# Altium footprint library Gen_Devices.pcblib: 211 footprints (part 6 of 14)
Each footprint in its own frame and in the unit in brackets; x right, y up, seen from the top. Pads: shape width x height; smd on the part's side, far side on the other; paste and mask are expansions set on the pad; w line width, h text height; cw(c..) or ccw(c..) is an arc to the next point about the centre after c.
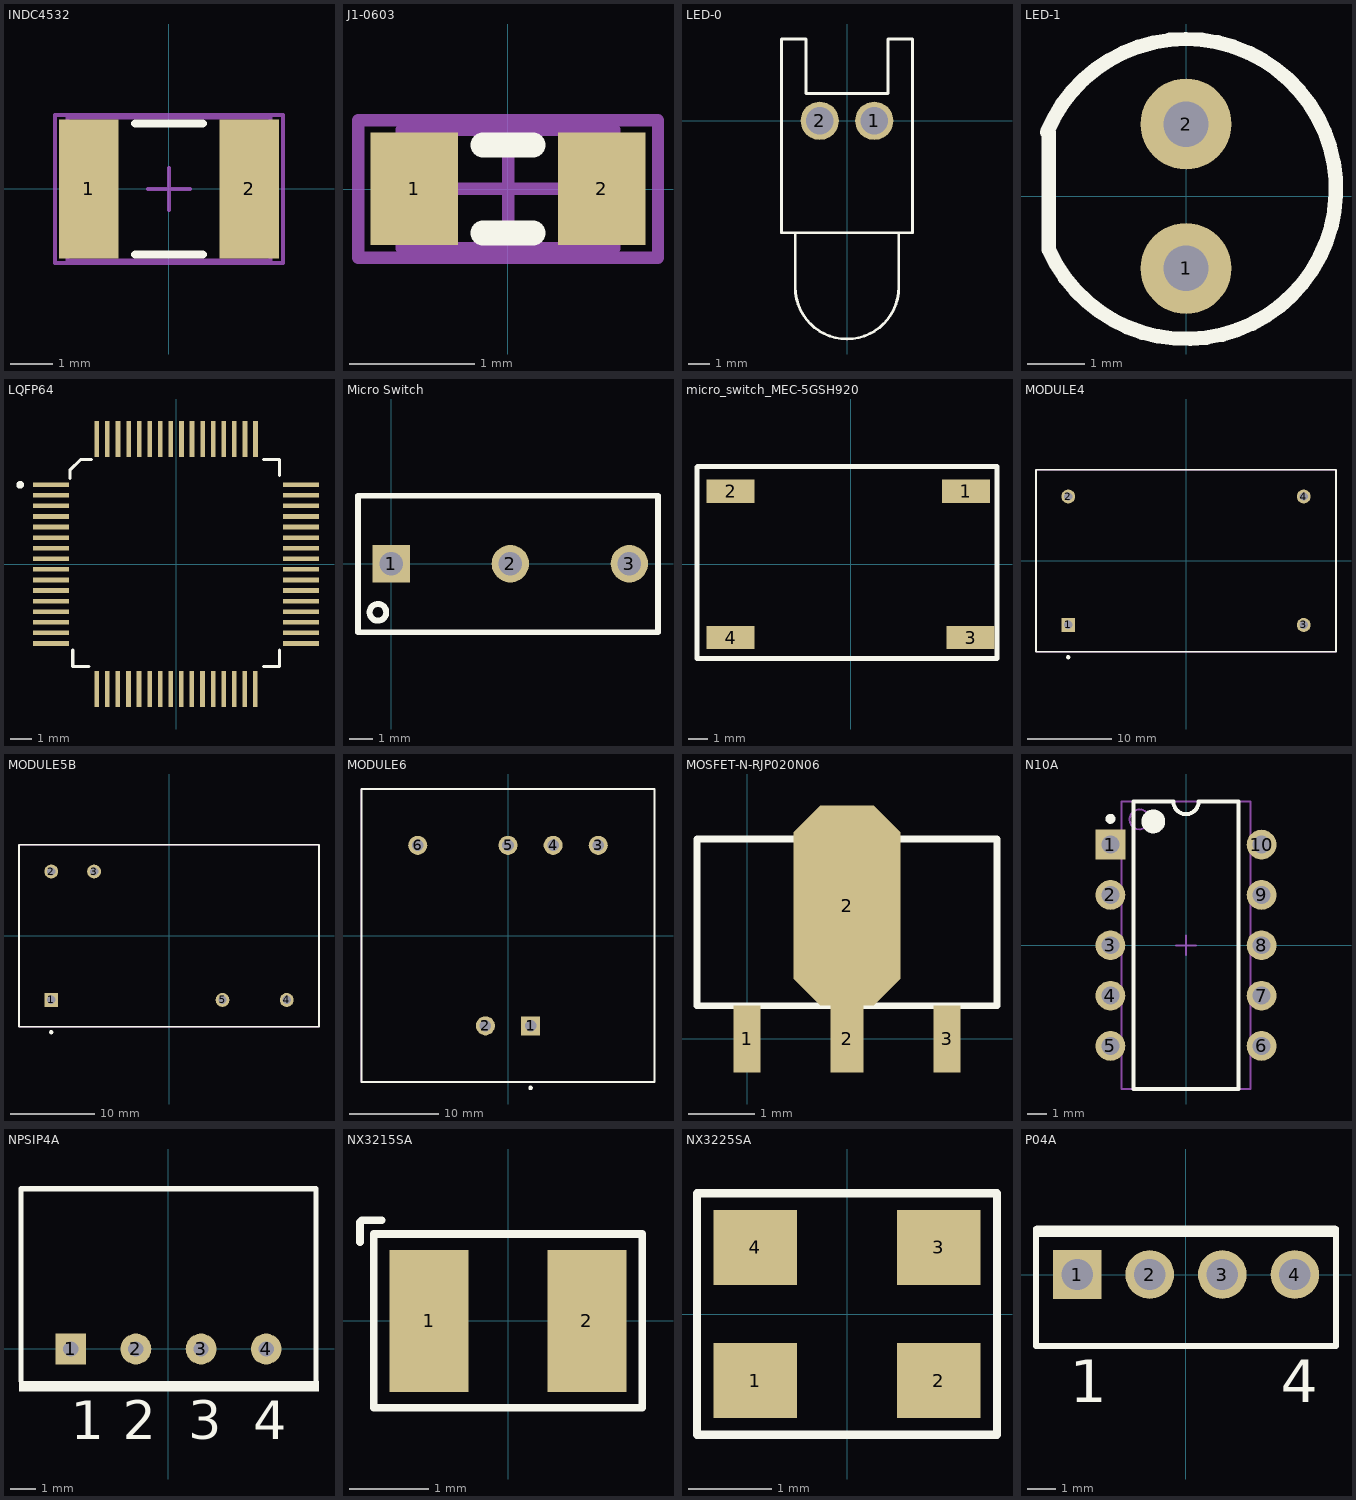
[diagram p5: the footprints below, top view; thin cyan lines are the x and y axes]

## INDC4532 [mm] "Chip Inductor, Body 4.5x3.2mm, IPC High Density"
height 0.55
pads (2):
  rect 1.4x3.3 smd: 1(-1.9,0) 2(1.9,0)
Top Overlay:
  lines w0.2: -0.8,-1.55 0.8,-1.55 ; -0.8,1.55 0.8,1.55
Mechanical 13:
  lines w0.1: -2.4,-1.7 2.4,-1.7 2.4,1.7 -2.4,1.7 -2.4,-1.7
Mechanical 15:
  lines w0.1: -0.5,0 0.5,0 ; 0,-0.5 0,0.5 ; -2.7,-1.75 2.7,-1.75 2.7,1.75 -2.7,1.75 -2.7,-1.75
3D body: height 0.55, standoff 0, extent -2.4,-1.7 2.4,1.7

## J1-0603 [mm] "Chip Resistor, Body 1.6x0.8mm, IPC High Density"
height 0.9
pads (2):
  rect 0.7x0.9 smd: 1(-0.75,0) 2(0.75,0)
Top Overlay:
  lines w0.2: -0.2,-0.35 0.2,-0.35 ; -0.2,0.35 0.2,0.35
Mechanical 13:
  lines w0.1: -0.85,-0.475 -0.85,0.475 0.85,0.475 0.85,-0.475 -0.85,-0.475
Mechanical 15:
  lines w0.1: -0.475,0 0.475,0 ; 0,-0.475 0,0.475 ; -1.2,-0.55 -1.2,0.55 1.2,0.55 1.2,-0.55 -1.2,-0.55
3D body: height 0.9, standoff 0, extent -0.85,-0.475 0.85,0.475

## LED-0 [mil] "LED; 2 Leads"
pads (2):
  round 70 hole 50: 1(50,0) 2(-50,0)
Top Overlay:
  lines w5: -95,-205 -95,-305 ccw(c0,-305) 95,-305 95,-205 ; -120,-205 -120,150 -75,150 -75,50 75,50 75,150 120,150 120,-205 -120,-205

## LED-1 [mm] "LED; 2 Leads"
pads (2):
  round 1.6 hole 0.8: 1(0,-1.27) 2(0,1.27)
Top Overlay:
  lines w0.254: -2.443,1.125 cw(c0,0.127) -2.413,-0.942 -2.413,1.113
3D body "GREENLED.step": height 5.38, standoff -3.17, extent -1.55,-1.967 1.942,2.017

## LQFP64 [mm]
pads (64):
  rect 1.7x0.22 smd: 1(-5.901,3.747) 2(-5.901,3.247) 3(-5.901,2.747) 4(-5.901,2.247) 5(-5.901,1.747) 6(-5.901,1.247) 7(-5.901,0.747) 8(-5.901,0.247) 9(-5.901,-0.253) 10(-5.901,-0.753) 11(-5.901,-1.253) 12(-5.901,-1.753) 13(-5.901,-2.253) 14(-5.901,-2.753) 15(-5.901,-3.253) 16(-5.901,-3.753) 33(5.902,-3.753) 34(5.902,-3.253) 35(5.902,-2.753) 36(5.902,-2.253) 37(5.902,-1.753) 38(5.902,-1.253) 39(5.902,-0.753) 40(5.902,-0.253) 41(5.902,0.247) 42(5.902,0.747) 43(5.902,1.247) 44(5.902,1.747) 45(5.902,2.247) 46(5.902,2.747) 47(5.902,3.247) 48(5.902,3.747)
  rect 0.22x1.7 smd: 17(-3.753,-5.901) 18(-3.253,-5.901) 19(-2.753,-5.901) 20(-2.253,-5.901) 21(-1.753,-5.901) 22(-1.253,-5.901) 23(-0.753,-5.901) 24(-0.253,-5.901) 25(0.247,-5.901) 26(0.747,-5.901) 27(1.247,-5.901) 28(1.747,-5.901) 29(2.247,-5.901) 30(2.747,-5.901) 31(3.247,-5.901) 32(3.747,-5.901) 49(3.754,5.902) 50(3.254,5.902) 51(2.754,5.902) 52(2.254,5.902) 53(1.754,5.902) 54(1.254,5.902) 55(0.754,5.902) 56(0.254,5.902) 57(-0.246,5.902) 58(-0.746,5.902) 59(-1.246,5.902) 60(-1.746,5.902) 61(-2.246,5.902) 62(-2.746,5.902) 63(-3.246,5.902) 64(-3.746,5.902)
Top Overlay:
  circle w0.25: c-7.366,3.742 r0.059
  lines w0.152: -5.016,4.049 -5.016,4.43 -4.508,4.938 -4,4.938 ; -4.889,-4.079 -4.889,-4.841 -4.127,-4.841 ; 4.128,-4.841 4.89,-4.841 4.89,-4.079 ; 4.128,4.938 4.89,4.938 4.89,4.176
3D body "LQFP64-1.step": height 1.56, standoff 0, extent -6,-6 6,6

## Micro Switch [mm]
pads (3):
  rect 1.6x1.6 hole 1: 1(-0.005,-0.004)
  round 1.6 hole 1: 2(5.075,-0.004) 3(10.155,-0.004)
Top Overlay:
  circle w0.254: c-0.575,-2.079 r0.355
  lines w0.254: -1.425,-2.929 11.375,-2.929 11.375,2.896 11.006,2.896 9.919,2.896 5.55,2.896 -1.425,2.896 -1.425,-2.904
3D body "Micro Switch.stp": height 3.1, standoff -11.1, extent -1.342,-2.854 12.292,3.196

## micro_switch_MEC-5GSH920 [mm]
pads (4):
  rect 2.5x1.2 smd: 1(6,3.81) 2(-6.25,3.81) 3(6.25,-3.81) 4(-6.25,-3.81)
Top Overlay:
  lines w0.254: -8,5.075 -8,-4.9 7.625,-4.9 7.625,5.1 -7.975,5.1
3D body "switch_mec_5GSH9.stp": height 6.4, standoff 0, extent -7.05,-4.975 6.95,5.025

## MODULE4 [mm] "DIP; 4 Round Pins; Row Space 27.94 mm; Pitch 15.24 mm"
height 14
pads (4):
  rect 1.65x1.65 hole 1: 1(-13.97,-7.62)
  round 1.65 hole 1: 2(-13.97,7.62) 3(13.97,-7.62) 4(13.97,7.62)
Top Overlay:
  circle w0.25: c-13.97,-11.45 r0.125
  lines w0.2: -17.8,-10.8 -17.8,10.8 17.8,10.8 17.8,-10.8 -17.8,-10.8
Mechanical 13:
  lines w0.1: -17.8,-10.8 -17.8,10.8 17.8,10.8 17.8,-10.8 -17.8,-10.8
3D body: height 14, standoff 0, extent -17.8,-10.8 17.8,10.8

## MODULE5B [mm] "DIP; 5 Round Pins; Row Space 15.24 mm; Pitch 2.54 mm"
height 14
pads (5):
  rect 1.65x1.65 hole 1: 1(-13.97,-7.62)
  round 1.65 hole 1: 2(-13.97,7.62) 3(-8.89,7.62) 4(13.97,-7.62) 5(6.35,-7.62)
Top Overlay:
  circle w0.25: c-13.97,-11.45 r0.125
  lines w0.2: -17.8,-10.8 -17.8,10.8 17.8,10.8 17.8,-10.8 -17.8,-10.8
Mechanical 13:
  lines w0.1: -17.8,-10.8 17.8,-10.8 17.8,10.8 -17.8,10.8 -17.8,-10.8
3D body: height 14, standoff 0, extent -17.8,-10.8 17.8,10.8

## MODULE6 [mm] "DIP; 6 Round Pins; Row Space 20.32 mm; Pitch 2.54 mm"
height 16.5
pads (6):
  rect 2.15x2.15 hole 1.3: 1(2.54,-10.16)
  round 2.15 hole 1.3: 2(-2.54,-10.16) 3(10.16,10.16) 4(5.08,10.16) 5(0,10.16) 6(-10.16,10.16)
Top Overlay:
  circle w0.25: c2.54,-17.15 r0.125
  lines w0.2: -16.5,-16.5 16.5,-16.5 16.5,16.5 -16.5,16.5 -16.5,-16.5
Mechanical 13:
  lines w0.1: -16.5,-16.5 16.5,-16.5 16.5,16.5 -16.5,16.5 -16.5,-16.5
3D body: height 16.5, standoff 0, extent -16.5,-16.5 16.5,16.5

## MOSFET-N-RJP020N06 [mm]
pads (4):
  rect 0.4x1 smd: 1(0,0) 3(3,0)
  rect 0.5x1 smd: 2(1.5,0)
  oct 1.6x3 smd: 2(1.5,2)
Top Overlay:
  lines w0.1: -0.75,0.5 3.75,0.5 3.75,3 -0.75,3 -0.75,0.5
3D body "MOSFET-N- RJP020N06T100.stp": height 1.49, standoff -0.01, extent -0.75,-0.45 3.75,3.55

## N10A [mm] "DIP; 10 Leads; Row Spacing 7.62 mm; Pitch 2.54 mm"
height 5.08
pads (10):
  rect 1.5x1.5 hole 0.9: 1(-3.81,5.08)
  round 1.5 hole 0.9: 2(-3.81,2.54) 3(-3.81,0) 4(-3.81,-2.54) 5(-3.81,-5.08) 6(3.81,-5.08) 7(3.81,-2.54) 8(3.81,0) 9(3.81,2.54) 10(3.81,5.08)
Top Overlay:
  circle w0.6: c-1.65,6.25 r0.3
  circle w0.25: c-3.81,6.38 r0.125
  lines w0.2: -2.65,-7.25 2.65,-7.25 2.65,7.25 0.635,7.25 cw(c0,7.25) -0.635,7.25 -2.65,7.25 -2.65,-7.25
Mechanical 13:
  circle w0.1: c-2.35,6.35 r0.5
  lines w0.1: -3.25,-7.25 3.25,-7.25 3.25,7.25 -3.25,7.25 -3.25,-7.25
Mechanical 15:
  lines w0.1: -0.5,0 0.5,0 ; 0,-0.5 0,0.5
3D body: height 5.08, standoff 0, extent -3.25,-7.25 3.25,7.25

## NPSIP4A [mm] "SIP; 4 Leads; Body 10 x 11.5 x 7.5 mm (typ); Pitch 2.54 mm"
height 10.6
pads (4):
  rect 1.2x1.2 hole 0.6: 1(-3.81,0)
  round 1.2 hole 0.6: 2(-1.27,0) 3(1.27,0) 4(3.81,0)
Top Overlay:
  rectangle: -5.83,-1.65 5.87,-1.25
  lines w0.2: -5.75,-1.25 -5.75,6.25 5.75,6.25 5.75,-1.25
  text "1" at -3.81,-3.52 h1.5
  text "2" at -1.778,-3.52 h1.5
  text "3" at 0.762,-3.52 h1.5
  text "4" at 3.302,-3.52 h1.5

## NX3215SA [mm] "QUARTZ-32.768kHz"
pads (2):
  rect 1x1.8 smd mask+0.2: 1(-1,0) 2(1,0)
Top Overlay:
  lines w0.1: -1.875,1 -1.875,1.25 -1.85,1.275 -1.6,1.275 ; -1.7,-1.1 -1.7,1.1 1.7,1.1 1.7,-1.1 -1.7,-1.1
3D body "QUARTZ_NX3215SA.step": height 0.78, standoff 0, extent -1.507,-0.75 1.507,0.764

## NX3225SA [mm] "QUARTZ - 12 to 50MHz"
pads (4):
  rect 1x0.9 smd mask+0.2: 1(-1.1,-0.8) 2(1.1,-0.8) 3(1.1,0.8) 4(-1.1,0.8)
Top Overlay:
  lines w0.1: -1.8,-1.45 1.8,-1.45 1.8,1.45 -1.8,1.45 -1.8,-1.45
3D body: height 1, standoff 0, extent -1.8,-1.45 1.8,1.45

## P04A [mm] "TO, Thru-Hole, Vertical, Heatsink Mounted; 4 In-Line Leads; Pitch 2.54 mm"
height 20.6
pads (4):
  rect 1.7x1.7 hole 1.1: 1(-3.81,0)
  round 1.7 hole 1.1: 2(-1.27,0) 3(1.27,0) 4(3.81,0)
Top Overlay:
  rectangle: -5.25,1.311 5.25,1.711
  lines w0.2: -5.25,1.6 -5.25,-2.5 5.25,-2.5 5.25,1.6
  text "4" at 3.31,-4.475 h1.5
  text "1" at -4.06,-4.475 h1.5